# Altium footprint library THU.PcbLib: 477 footprints (part 3 of 30)
Each footprint in its own frame and in the unit in brackets; x right, y up, seen from the top. Pads: shape width x height; smd on the part's side, far side on the other; paste and mask are expansions set on the pad; w line width, h text height; cw(c..) or ccw(c..) is an arc to the next point about the centre after c.
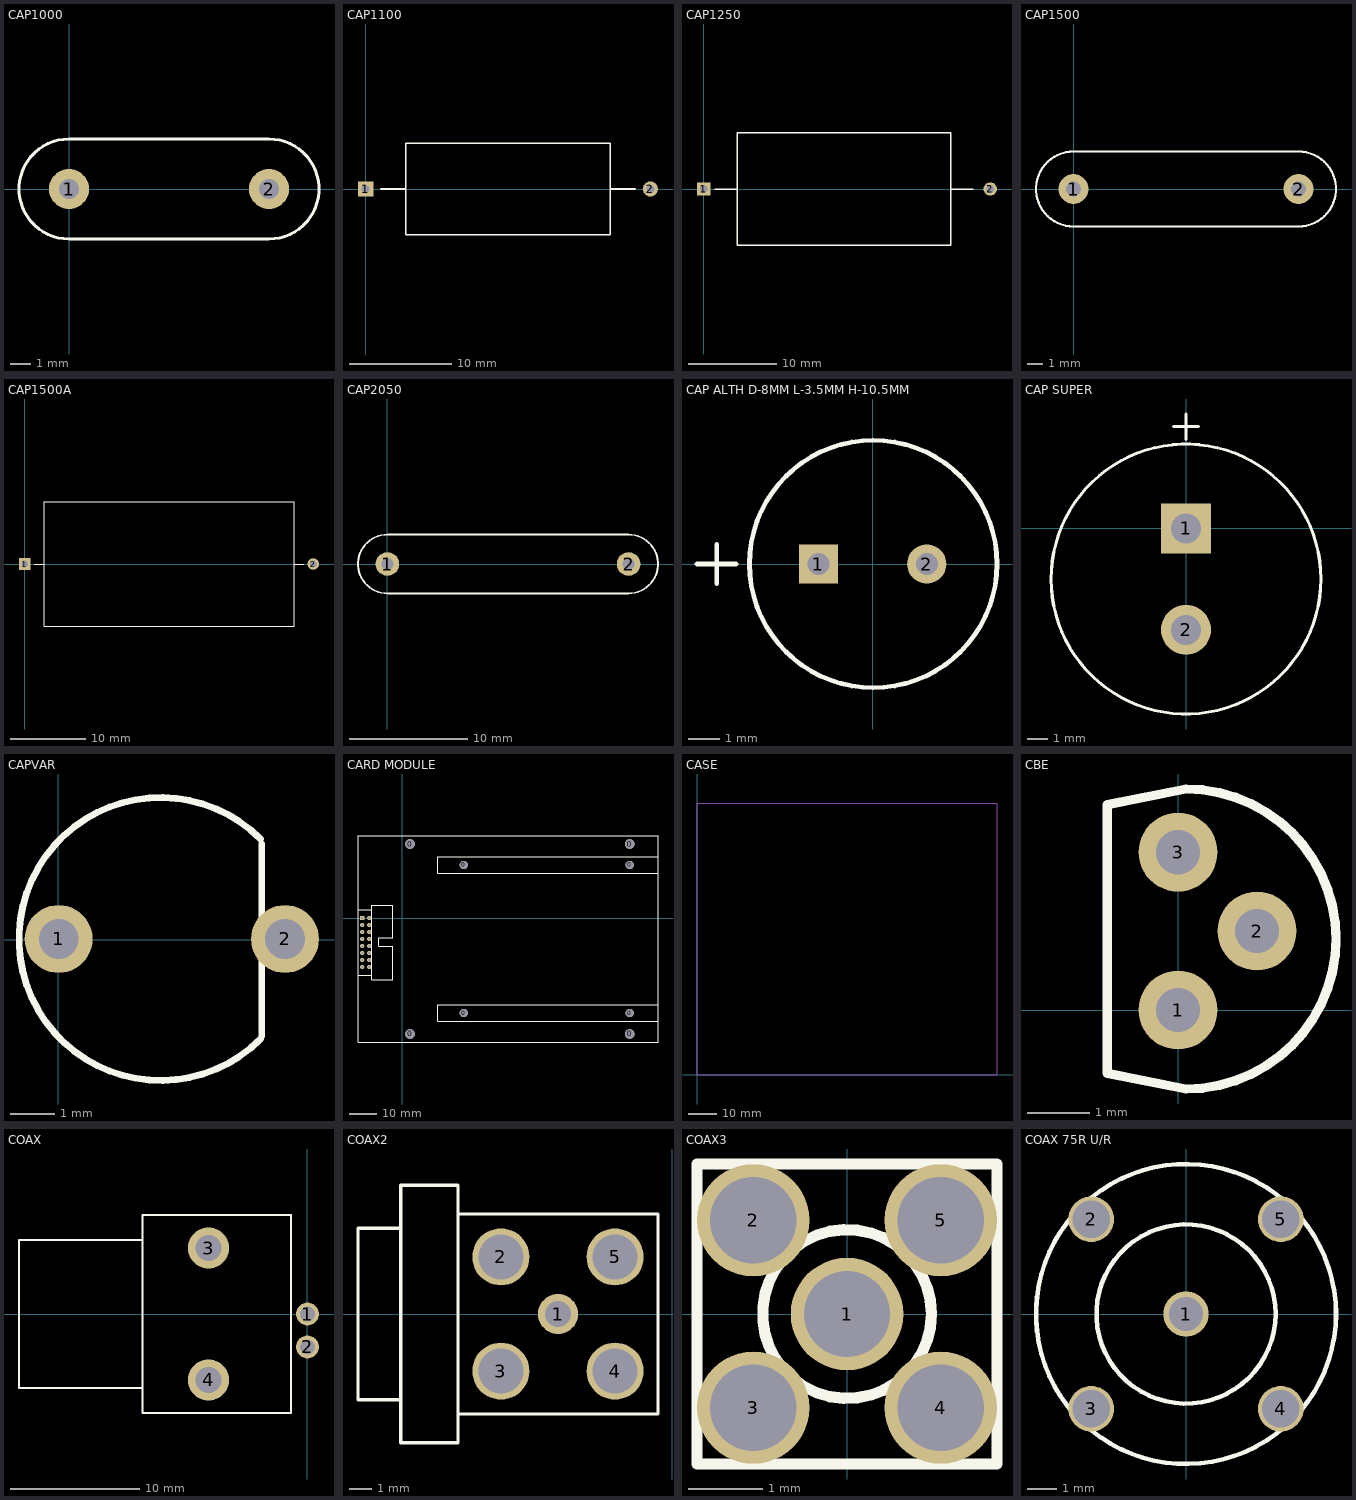
[diagram p2: the footprints below, top view; thin cyan lines are the x and y axes]

## CAP1000 [mm]
pads (2):
  round 2 hole 1: 1(0,0) 2(10,0)
TopOverlay:
  lines w0.152: 0,-2.5 cw(c0,0) 0,2.5 10,2.5 cw(c10,0) 10,-2.5 0,-2.5

## CAP1100 [mm]
pads (2):
  rect 1.5x1.5 hole 0.8: 1(0,0)
  round 1.5 hole 0.8: 2(28,0)
TopOverlay:
  lines w0.152: 1.5,0 3.925,0 ; 24.075,0 26.5,0 ; 3.925,0 3.925,4.5 24.075,4.5 24.075,-4.5 3.925,-4.5 3.925,0

## CAP1250 [mil]
pads (2):
  rect 60x60 hole 34: 1(0,0)
  round 60 hole 34: 2(1275,0)
TopOverlay:
  lines w6: 50,0 150,0 ; 1200,0 1100,0 ; 1100,0 1100,-250 150,-250 150,250 1100,250 1100,0

## CAP1500 [mm]
pads (2):
  round 2 hole 1: 1(0,0) 2(15,0)
TopOverlay:
  lines w0.152: 0,-2.5 cw(c0,0) 0,2.5 15,2.5 cw(c15,0) 15,-2.5 0,-2.5

## CAP1500A [mil]
pads (2):
  rect 60x60 hole 34: 1(0,0)
  round 60 hole 34: 2(1500,0)
TopOverlay:
  lines w6: 50,0 100,0 ; 1450,0 1400,0 ; 1400,0 1400,-325 100,-325 100,325 1400,325 1400,0

## CAP2050 [mm] "Coupling and bypass capacitor, pitch 20.5mm"
pads (2):
  round 2 hole 1: 1(0,0) 2(20.5,0)
TopOverlay:
  lines w0.152: 0,-2.5 cw(c0,0) 0,2.5 20.5,2.5 cw(c20.5,0) 20.5,-2.5 0,-2.5

## CAP ALTH D-8MM L-3.5MM H-10.5MM [mil]
pads (2):
  rect 50x50 hole 28: 1(-68.9,0)
  round 50 hole 28: 2(68.9,0)
TopOverlay:
  circle w6: c0.79,0 r157.48
  lines w6: -223.43,0 -173.43,0 ; -198.43,-25 -198.43,25
3D body "CAP ALTH D-8MM L-3.5MM H-10.5MM.STEP": height 421.26, standoff -118.11, extent -157.48,-157.45 157.48,157.45

## CAP SUPER [mm] "EDLNF224A5R5C -  CAPACITOR SUPER 0.22F 5.5V 75 OHM STKDCOIN"
height 9.5
pads (2):
  rect 2.5x2.5 hole 1.5: 1(0,0)
  round 2.5 hole 1.5: 2(0,-5.08)
TopOverlay:
  circle w0.152: c0,-2.54 r6.75
  lines w0.152: -0.635,5.08 0.635,5.08 ; 0,4.445 0,5.715

## CAPVAR [mil]
pads (2):
  round 60 hole 35: 1(0.5,0.81) 2(200.5,0.81)
TopOverlay:
  lines w6: 178.89,-87.58 cw(c90.5,0.81) 178.89,89.19 ; 180,-85 180,85

## CARD MODULE [mil]
pads (24):
  round 137.8 hole 137.8: 0(110,-1660) 0(110,1060) 0(3255,-1660) 0(3255,1060)
  round 118.11 hole 118.11: 0(880,-1360) 0(880,760) 0(3255,-1360) 0(3255,760)
  rect 60x60 hole 34: 1(-575,0)
  round 60 hole 34: 2(-475,0) 3(-575,-100) 4(-475,-100) 5(-575,-200) 6(-475,-200) 7(-575,-300) 8(-475,-300) 9(-575,-400) 10(-475,-400) 11(-575,-500) 12(-475,-500) 13(-575,-600) 14(-475,-600) 15(-575,-700) 16(-475,-700)
TopOverlay:
  lines w6: -635,-820 -435,-820 ; -435,120 -635,120 ; 3660,-1240 510,-1240 510,-1480 3660,-1480 ; 3660,640 510,640 510,880 3660,880 ; -635,120 -635,1180 3660,1180 3660,880 ; -635,120 -635,-720 -635,-1480 -635,-1780 3660,-1780 3660,-1480 ; 3660,-1480 3660,20 3660,880 ; -435,-880 -135,-880 -135,-405 -335,-405 -335,-285 -135,-285 -135,180 -435,180 -435,-880

## CASE [mil]
Mechanical1:
  lines w6: 0,0 0,3750 4150,3750 4150,0 0,0

## CBE [mil]
pads (3):
  round 50 hole 28: 1(0,0) 2(50,50) 3(0,100)
TopOverlay:
  lines w6: -45,-40 -45,130 5,140 cw(c5,45) 5,-50 -45,-40

## COAX [mil]
pads (4):
  round 70 hole 46: 1(0,0) 2(0,-100)
  round 125 hole 79: 3(-300,200) 4(-300,-200)
TopOverlay:
  lines w6: -500,-225 -875,-225 -875,225 -500,225 ; -500,-300 -50,-300 -50,300 -500,300 -500,-300

## COAX2 [mil]
pads (5):
  round 70 hole 46: 1(-200,0)
  round 100 hole 79: 2(-300,100) 3(-300,-100) 4(-100,-100) 5(-100,100)
TopOverlay:
  lines w6: -475,-150 -550,-150 -550,150 -475,150 ; -375,-175 -375,175 ; -375,-175 -25,-175 -25,175 -375,175 ; -375,-175 -375,-225 -475,-225 -475,225 -375,225 -375,175

## COAX3 [mil]
pads (5):
  round 60 hole 46: 1(0,0) 2(-50,50) 3(-50,-50) 4(50,-50) 5(50,50)
TopOverlay:
  circle w6: c0,0 r45
  lines w6: -80,-80 80,-80 80,80 -80,80 -80,-80

## COAX 75R U/R [mil]
pads (5):
  round 60 hole 45: 1(0,0)
  round 60 hole 50: 2(-125,125) 3(-125,-125) 4(125,-125) 5(125,125)
TopOverlay:
  circle w6: c0,0 r197.83
  circle w6: c0,0 r118.11